# Altium footprint library PcbLibWatch.PcbLib: 17 footprints (part 2 of 2)
Each footprint in its own frame and in the unit in brackets; x right, y up, seen from the top. Pads: shape width x height; smd on the part's side, far side on the other; paste and mask are expansions set on the pad; w line width, h text height; cw(c..) or ccw(c..) is an arc to the next point about the centre after c.
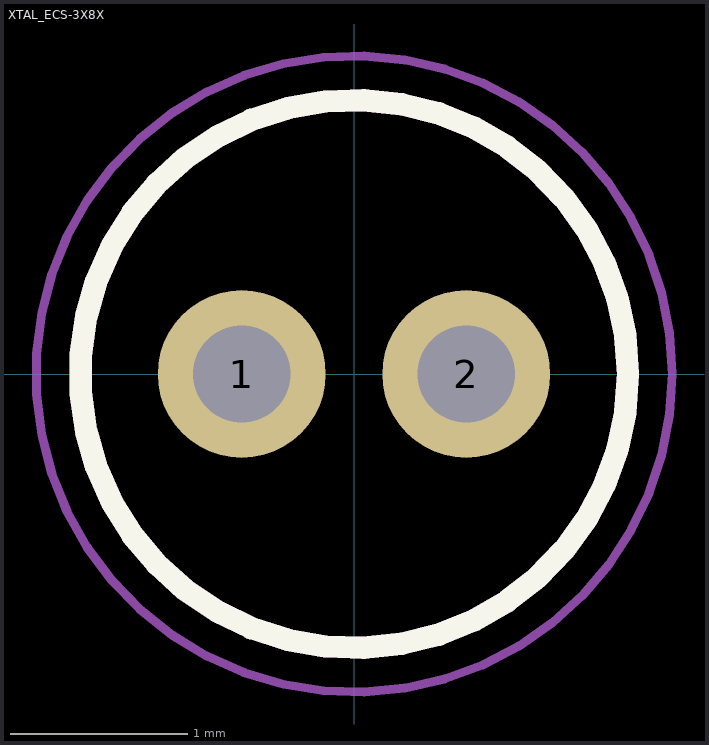
[diagram p1: the footprint, top view; thin cyan lines are the x and y axes]

## XTAL_ECS-3X8X [mm]
pads (2):
  round 0.95 hole 0.55: 1(-0.635,0) 2(0.635,0)
Top Overlay:
  circle w0.127: c0,0 r1.55
Mechanical 13:
  circle w0.127: c0,0 r1.55
Mechanical 15:
  circle w0.05: c0,0 r1.8
3D body "ECS-3X8X-40055.STEP": height 8.7, standoff -9.5, extent -1.55,-1.55 1.55,1.55